# Altium footprint library My Footprint.PcbLib: 268 footprints (part 12 of 17)
Each footprint in its own frame and in the unit in brackets; x right, y up, seen from the top. Pads: shape width x height; smd on the part's side, far side on the other; paste and mask are expansions set on the pad; w line width, h text height; cw(c..) or ccw(c..) is an arc to the next point about the centre after c.
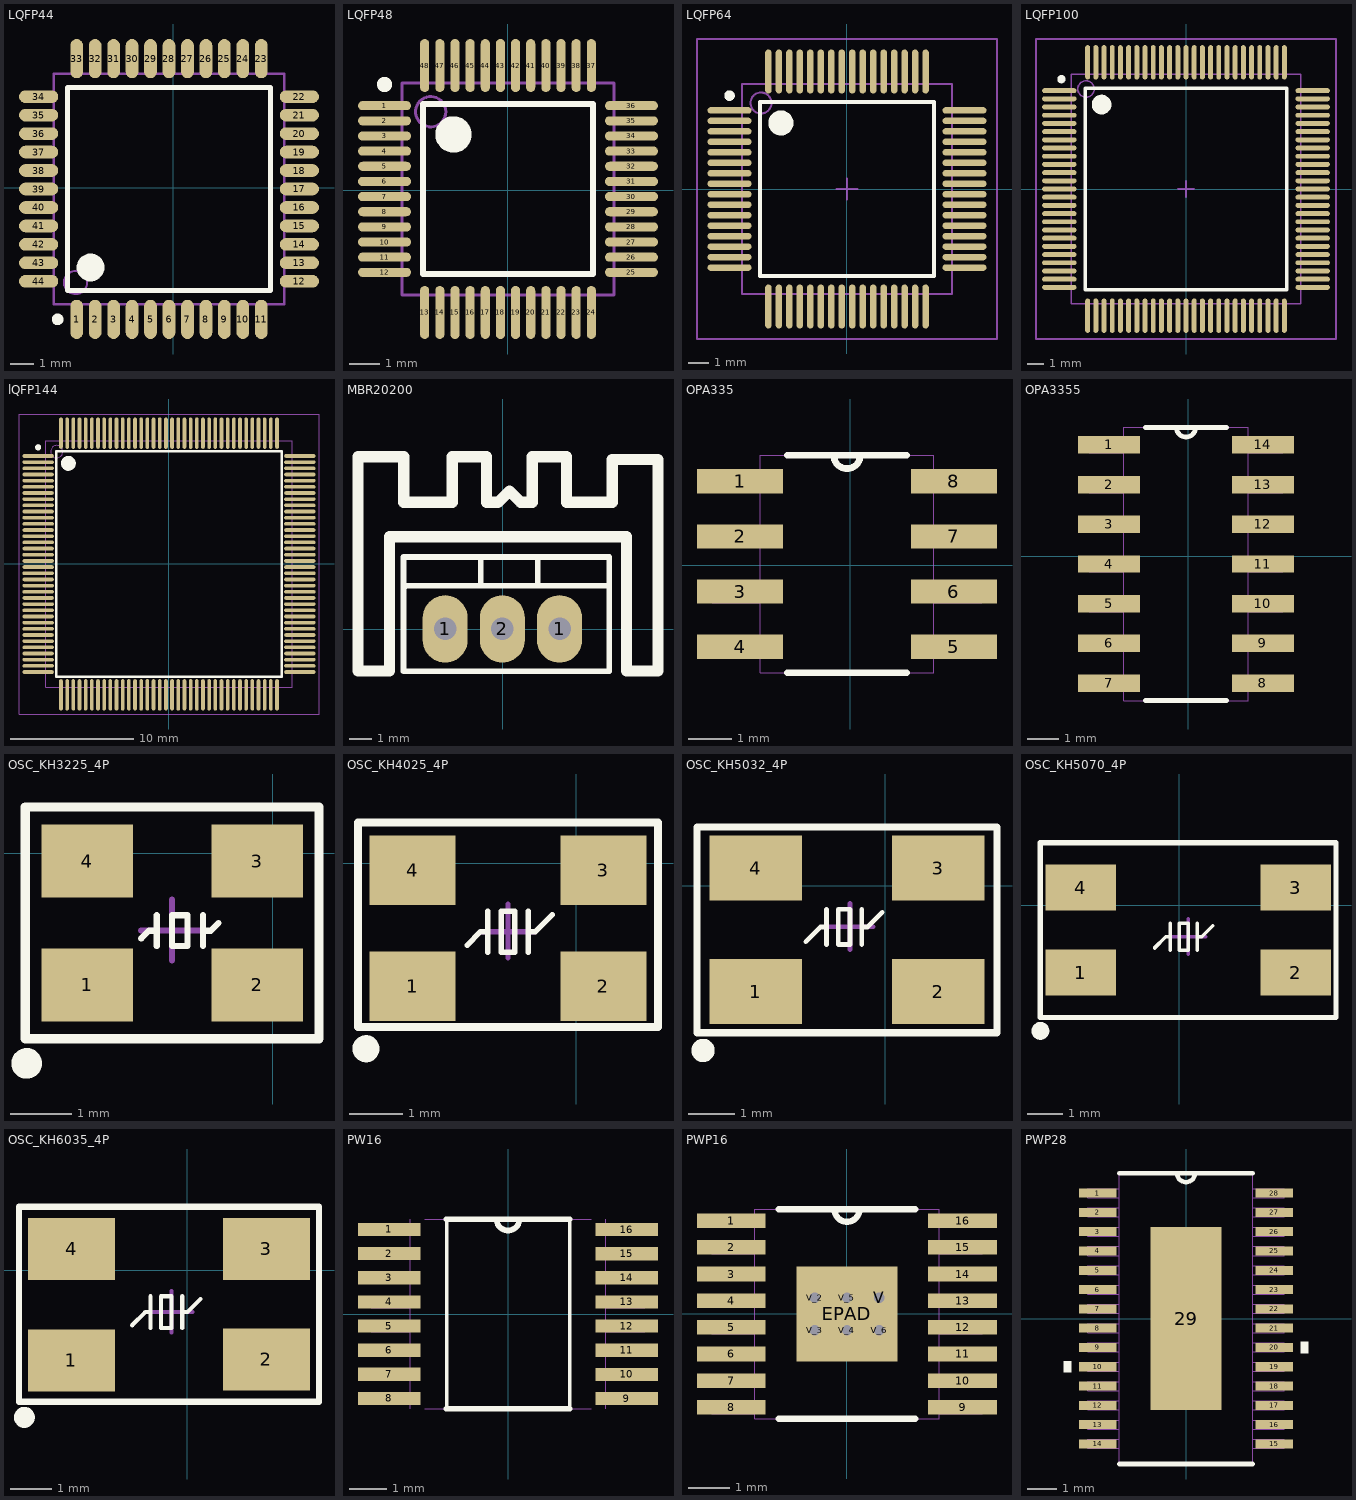
[diagram p11: the footprints below, top view; thin cyan lines are the x and y axes]

## LQFP44 [mm]
pads (44):
  oval 0.55x1.7 smd: 1(-4.191,-5.715) 2(-3.391,-5.715) 3(-2.591,-5.715) 4(-1.791,-5.715) 5(-0.991,-5.715) 6(-0.191,-5.715) 7(0.609,-5.715) 8(1.409,-5.715) 9(2.209,-5.715) 10(3.009,-5.715) 11(3.809,-5.715) 23(3.809,5.585) 24(3.009,5.585) 25(2.209,5.585) 26(1.409,5.585) 27(0.609,5.585) 28(-0.191,5.585) 29(-0.991,5.585) 30(-1.791,5.585) 31(-2.591,5.585) 32(-3.391,5.585) 33(-4.191,5.585)
  oval 1.7x0.55 smd: 12(5.459,-4.065) 13(5.459,-3.265) 14(5.459,-2.465) 15(5.459,-1.665) 16(5.459,-0.865) 17(5.459,-0.065) 18(5.459,0.735) 19(5.459,1.535) 20(5.459,2.335) 21(5.459,3.135) 22(5.459,3.935) 34(-5.841,3.935) 35(-5.841,3.135) 36(-5.841,2.335) 37(-5.841,1.535) 38(-5.841,0.735) 39(-5.841,-0.065) 40(-5.841,-0.865) 41(-5.841,-1.665) 42(-5.841,-2.465) 43(-5.841,-3.265) 44(-5.841,-4.065)
Top Overlay:
  circle w0.6: c-3.591,-3.465 r0.3
  circle w0.25: c-5.016,-5.715 r0.125
  lines w0.2: -4.591,-4.465 -4.591,4.335 4.209,4.335 4.209,-4.465 -4.591,-4.465
Mechanical 13:
  circle w0.1: c-4.241,-4.115 r0.5
  lines w0.1: -5.191,-5.065 -5.191,4.935 4.809,4.935 4.809,-5.065 -5.191,-5.065
3D body: height 1.5, standoff 0.1, extent -5.19,-5.064 4.808,4.934

## LQFP48 [mm]
pads (48):
  oval 1.75x0.3 smd: 1(-4.064,2.794) 2(-4.064,2.294) 3(-4.064,1.794) 4(-4.064,1.294) 5(-4.064,0.794) 6(-4.064,0.294) 7(-4.064,-0.206) 8(-4.064,-0.706) 9(-4.064,-1.206) 10(-4.064,-1.706) 11(-4.064,-2.206) 12(-4.064,-2.706) 25(4.086,-2.706) 26(4.086,-2.206) 27(4.086,-1.706) 28(4.086,-1.206) 29(4.086,-0.706) 30(4.086,-0.206) 31(4.086,0.294) 32(4.086,0.794) 33(4.086,1.294) 34(4.086,1.794) 35(4.086,2.294) 36(4.086,2.794)
  oval 0.3x1.75 smd: 13(-2.739,-4.031) 14(-2.239,-4.031) 15(-1.739,-4.031) 16(-1.239,-4.031) 17(-0.739,-4.031) 18(-0.239,-4.031) 19(0.261,-4.031) 20(0.761,-4.031) 21(1.261,-4.031) 22(1.761,-4.031) 23(2.261,-4.031) 24(2.761,-4.031) 37(2.761,4.119) 38(2.261,4.119) 39(1.761,4.119) 40(1.261,4.119) 41(0.761,4.119) 42(0.261,4.119) 43(-0.239,4.119) 44(-0.739,4.119) 45(-1.239,4.119) 46(-1.739,4.119) 47(-2.239,4.119) 48(-2.739,4.119)
Top Overlay:
  circle w0.25: c-4.064,3.494 r0.125
  circle w0.6: c-1.789,1.844 r0.3
  lines w0.2: -2.789,-2.756 -2.789,2.844 2.811,2.844 2.811,-2.756 -2.789,-2.756
Mechanical 13:
  circle w0.1: c-2.539,2.594 r0.5
  lines w0.1: -3.489,-3.456 -3.489,3.544 3.511,3.544 3.511,-3.456 -3.489,-3.456
3D body "LQFP7X7-48.STEP": height 1.56, standoff 0, extent -4.5,-4.436 4.5,4.564

## LQFP64 [mm] "中等容量RBT6"
pads (64):
  oval 2.1x0.3 smd: 1(-5.6,3.75) 2(-5.6,3.25) 3(-5.6,2.75) 4(-5.6,2.25) 5(-5.6,1.75) 6(-5.6,1.25) 7(-5.6,0.75) 8(-5.6,0.25) 9(-5.6,-0.25) 10(-5.6,-0.75) 11(-5.6,-1.25) 12(-5.6,-1.75) 13(-5.6,-2.25) 14(-5.6,-2.75) 15(-5.6,-3.25) 16(-5.6,-3.75) 33(5.6,-3.75) 34(5.6,-3.25) 35(5.6,-2.75) 36(5.6,-2.25) 37(5.6,-1.75) 38(5.6,-1.25) 39(5.6,-0.75) 40(5.6,-0.25) 41(5.6,0.25) 42(5.6,0.75) 43(5.6,1.25) 44(5.6,1.75) 45(5.6,2.25) 46(5.6,2.75) 47(5.6,3.25) 48(5.6,3.75)
  oval 0.3x2.1 smd: 17(-3.75,-5.6) 18(-3.25,-5.6) 19(-2.75,-5.6) 20(-2.25,-5.6) 21(-1.75,-5.6) 22(-1.25,-5.6) 23(-0.75,-5.6) 24(-0.25,-5.6) 25(0.25,-5.6) 26(0.75,-5.6) 27(1.25,-5.6) 28(1.75,-5.6) 29(2.25,-5.6) 30(2.75,-5.6) 31(3.25,-5.6) 32(3.75,-5.6) 49(3.75,5.6) 50(3.25,5.6) 51(2.75,5.6) 52(2.25,5.6) 53(1.75,5.6) 54(1.25,5.6) 55(0.75,5.6) 56(0.25,5.6) 57(-0.25,5.6) 58(-0.75,5.6) 59(-1.25,5.6) 60(-1.75,5.6) 61(-2.25,5.6) 62(-2.75,5.6) 63(-3.25,5.6) 64(-3.75,5.6)
Top Overlay:
  circle w0.25: c-5.6,4.45 r0.125
  circle w0.6: c-3.15,3.15 r0.3
  lines w0.2: -4.15,-4.15 -4.15,4.15 4.15,4.15 4.15,-4.15 -4.15,-4.15
Mechanical 13:
  circle w0.1: c-4.1,4.1 r0.5
  lines w0.1: -5,-5 -5,5 5,5 5,-5 -5,-5
Mechanical 15:
  lines w0.1: -0.5,0 0.5,0 ; 0,-0.5 0,0.5 ; -7.15,-7.15 -7.15,7.15 7.15,7.15 7.15,-7.15 -7.15,-7.15
3D body "LQFP-64.STEP": height 1.6, standoff 0, extent -6,-6 6,6

## LQFP100 [mm]
pads (100):
  oval 2.1x0.3 smd: 1(-7.727,6) 2(-7.727,5.5) 3(-7.727,5) 4(-7.727,4.5) 5(-7.727,4) 6(-7.727,3.5) 7(-7.727,3) 8(-7.727,2.5) 9(-7.727,2) 10(-7.727,1.5) 11(-7.727,1) 12(-7.727,0.5) 13(-7.727,0) 14(-7.727,-0.5) 15(-7.727,-1) 16(-7.727,-1.5) 17(-7.727,-2) 18(-7.727,-2.5) 19(-7.727,-3) 20(-7.727,-3.5) 21(-7.727,-4) 22(-7.727,-4.5) 23(-7.727,-5) 24(-7.727,-5.5) 25(-7.727,-6) 51(7.727,-6) 52(7.727,-5.5) 53(7.727,-5) 54(7.727,-4.5) 55(7.727,-4) 56(7.727,-3.5) 57(7.727,-3) 58(7.727,-2.5) 59(7.727,-2) 60(7.727,-1.5) 61(7.727,-1) 62(7.727,-0.5) 63(7.727,0) 64(7.727,0.5) 65(7.727,1) 66(7.727,1.5) 67(7.727,2) 68(7.727,2.5) 69(7.727,3) 70(7.727,3.5) 71(7.727,4) 72(7.727,4.5) 73(7.727,5) 74(7.727,5.5) 75(7.727,6)
  oval 0.3x2.1 smd: 26(-6,-7.727) 27(-5.5,-7.727) 28(-5,-7.727) 29(-4.5,-7.727) 30(-4,-7.727) 31(-3.5,-7.727) 32(-3,-7.727) 33(-2.5,-7.727) 34(-2,-7.727) 35(-1.5,-7.727) 36(-1,-7.727) 37(-0.5,-7.727) 38(0,-7.727) 39(0.5,-7.727) 40(1,-7.727) 41(1.5,-7.727) 42(2,-7.727) 43(2.5,-7.727) 44(3,-7.727) 45(3.5,-7.727) 46(4,-7.727) 47(4.5,-7.727) 48(5,-7.727) 49(5.5,-7.727) 50(6,-7.727) 76(6,7.727) 77(5.5,7.727) 78(5,7.727) 79(4.5,7.727) 80(4,7.727) 81(3.5,7.727) 82(3,7.727) 83(2.5,7.727) 84(2,7.727) 85(1.5,7.727) 86(1,7.727) 87(0.5,7.727) 88(0,7.727) 89(-0.5,7.727) 90(-1,7.727) 91(-1.5,7.727) 92(-2,7.727) 93(-2.5,7.727) 94(-3,7.727) 95(-3.5,7.727) 96(-4,7.727) 97(-4.5,7.727) 98(-5,7.727) 99(-5.5,7.727) 100(-6,7.727)
Top Overlay:
  circle w0.6: c-5.15,5.15 r0.3
  circle w0.25: c-7.6,6.7 r0.125
  lines w0.2: -6.15,-6.15 6.15,-6.15 6.15,6.15 -6.15,6.15 -6.15,-6.15
Mechanical 13:
  circle w0.1: c-6.1,6.1 r0.5
  lines w0.1: -7,-7 7,-7 7,7 -7,7 -7,-7
Mechanical 15:
  lines w0.1: -0.5,0 0.5,0 ; 0,-0.5 0,0.5 ; -9.15,-9.15 9.15,-9.15 9.15,9.15 -9.15,9.15 -9.15,-9.15
3D body "LQFP-100.STEP": height 1.6, standoff 0, extent -7.999,-8 8.001,8

## lQFP144 [mm]
pads (144):
  oval 2.54x0.3 smd: 1(-10.6,8.75) 2(-10.6,8.25) 3(-10.6,7.75) 4(-10.6,7.25) 5(-10.6,6.75) 6(-10.6,6.25) 7(-10.6,5.75) 8(-10.6,5.25) 9(-10.6,4.75) 10(-10.6,4.25) 11(-10.6,3.75) 12(-10.6,3.25) 13(-10.6,2.75) 14(-10.6,2.25) 15(-10.6,1.75) 16(-10.6,1.25) 17(-10.6,0.75) 18(-10.6,0.25) 19(-10.6,-0.25) 20(-10.6,-0.75) 21(-10.6,-1.25) 22(-10.6,-1.75) 23(-10.6,-2.25) 24(-10.6,-2.75) 25(-10.6,-3.25) 26(-10.6,-3.75) 27(-10.6,-4.25) 28(-10.6,-4.75) 29(-10.6,-5.25) 30(-10.6,-5.75) 31(-10.6,-6.25) 32(-10.6,-6.75) 33(-10.6,-7.25) 34(-10.6,-7.75) 35(-10.6,-8.25) 36(-10.6,-8.75) 73(10.6,-8.75) 74(10.6,-8.25) 75(10.6,-7.75) 76(10.6,-7.25) 77(10.6,-6.75) 78(10.6,-6.25) 79(10.6,-5.75) 80(10.6,-5.25) 81(10.6,-4.75) 82(10.6,-4.25) 83(10.6,-3.75) 84(10.6,-3.25) 85(10.6,-2.75) 86(10.6,-2.25) 87(10.6,-1.75) 88(10.6,-1.25) 89(10.6,-0.75) 90(10.6,-0.25) 91(10.6,0.25) 92(10.6,0.75) 93(10.6,1.25) 94(10.6,1.75) 95(10.6,2.25) 96(10.6,2.75) 97(10.6,3.25) 98(10.6,3.75) 99(10.6,4.25) 100(10.6,4.75) 101(10.6,5.25) 102(10.6,5.75) 103(10.6,6.25) 104(10.6,6.75) 105(10.6,7.25) 106(10.6,7.75) 107(10.6,8.25) 108(10.6,8.75)
  oval 0.3x2.54 smd: 37(-8.75,-10.6) 38(-8.25,-10.6) 39(-7.75,-10.6) 40(-7.25,-10.6) 41(-6.75,-10.6) 42(-6.25,-10.6) 43(-5.75,-10.6) 44(-5.25,-10.6) 45(-4.75,-10.6) 46(-4.25,-10.6) 47(-3.75,-10.6) 48(-3.25,-10.6) 49(-2.75,-10.6) 50(-2.25,-10.6) 51(-1.75,-10.6) 52(-1.25,-10.6) 53(-0.75,-10.6) 54(-0.25,-10.6) 55(0.25,-10.6) 56(0.75,-10.6) 57(1.25,-10.6) 58(1.75,-10.6) 59(2.25,-10.6) 60(2.75,-10.6) 61(3.25,-10.6) 62(3.75,-10.6) 63(4.25,-10.6) 64(4.75,-10.6) 65(5.25,-10.6) 66(5.75,-10.6) 67(6.25,-10.6) 68(6.75,-10.6) 69(7.25,-10.6) 70(7.75,-10.6) 71(8.25,-10.6) 72(8.75,-10.6) 109(8.75,10.6) 110(8.25,10.6) 111(7.75,10.6) 112(7.25,10.6) 113(6.75,10.6) 114(6.25,10.6) 115(5.75,10.6) 116(5.25,10.6) 117(4.75,10.6) 118(4.25,10.6) 119(3.75,10.6) 120(3.25,10.6) 121(2.75,10.6) 122(2.25,10.6) 123(1.75,10.6) 124(1.25,10.6) 125(0.75,10.6) 126(0.25,10.6) 127(-0.25,10.6) 128(-0.75,10.6) 129(-1.25,10.6) 130(-1.75,10.6) 131(-2.25,10.6) 132(-2.75,10.6) 133(-3.25,10.6) 134(-3.75,10.6) 135(-4.25,10.6) 136(-4.75,10.6) 137(-5.25,10.6) 138(-5.75,10.6) 139(-6.25,10.6) 140(-6.75,10.6) 141(-7.25,10.6) 142(-7.75,10.6) 143(-8.25,10.6) 144(-8.75,10.6)
Top Overlay:
  circle w0.6: c-8.15,8.15 r0.3
  circle w0.25: c-10.6,9.45 r0.125
  lines w0.2: -9.15,-9.15 9.15,-9.15 9.15,9.15 -9.15,9.15 -9.15,-9.15
Mechanical 13:
  circle w0.1: c-9.1,9.1 r0.5
  lines w0.1: -10,-10 10,-10 10,10 -10,10 -10,-10
Mechanical 15:
  lines w0.05: -12.15,-12.15 12.15,-12.15 12.15,12.15 -12.15,12.15 -12.15,-12.15
3D body "LQFP20X20-144.STEP": height 1.6, standoff 0, extent -11,-11 11,11

## MBR20200 [mm]
pads (3):
  oval 2x3 hole 1: 1(-2.568,0.003) 1(2.512,0.003) 2(-0.028,0.003)
Top Overlay:
  lines w0.254: -4.42,1.549 -4.42,2.819 -4.42,3.2 4.724,3.2 4.724,1.676 ; -0.991,2.057 -0.991,3.2 ; 1.549,1.93 1.549,3.073 ; 4.597,1.93 -3.785,1.93 -4.293,1.93 -4.42,1.803 -4.42,-1.88 4.724,-1.88 4.724,1.93
  lines w0.5: -6.445,-1.861 -5.048,-1.861 -5.048,4.108 5.493,4.108 5.493,-1.861 6.89,-1.861 6.89,7.537 4.858,7.537 4.858,5.632 2.826,5.632 2.826,7.664 1.302,7.664 1.302,5.632 0.794,5.632 0.286,6.14 -0.222,5.632 -0.73,5.632 -0.73,7.664 -2.254,7.664 -2.254,5.632 -4.413,5.632 -4.413,7.664 -6.445,7.664 -6.445,5.632 -6.445,-1.861
3D body "三?": height 19.3, standoff -4.92, extent -5.182,-1.659 4.948,3.741

## OPA335 [mil]
pads (8):
  rect 78x22 smd: 1(-100,76) 2(-100,26) 3(-100,-24) 4(-100,-74) 5(94,-74) 6(94,-24) 7(94,26) 8(94,76)
Top Overlay:
  lines w6: -57.08,-97.5 51.08,-97.5 ; -57.08,99.5 51.08,99.5 ; -15,99.5 ccw(c-3,99.5) 9,99.5
Mechanical 1:
  lines w0: -15,99.5 ccw(c-3,99.5) 9,99.5 ; -125,-84 -125,-64 -81.5,-64 -81.5,-84 -125,-84 ; -125,-34 -125,-14 -81.5,-14 -81.5,-34 -125,-34 ; -125,16 -125,36 -81.5,36 -81.5,16 -125,16 ; -125,66 -125,86 -81.5,86 -81.5,66 -125,66 ; -81.5,-97.5 75.5,-97.5 75.5,99.5 -81.5,99.5 -81.5,-97.5 ; 75.5,-84 75.5,-64 119,-64 119,-84 75.5,-84 ; 75.5,-34 75.5,-14 119,-14 119,-34 75.5,-34 ; 75.5,16 75.5,36 119,36 119,16 75.5,16 ; 75.5,66 75.5,86 119,86 119,66 75.5,66
3D body "D0008A.stp": height 64.61, standoff 0.63, extent -121.11,-95.46 115.11,97.45

## OPA3355 [mil]
pads (14):
  rect 78x22 smd: 1(-100,140) 2(-100,90) 3(-100,40) 4(-100,-10) 5(-100,-60) 6(-100,-110) 7(-100,-160) 8(94,-160) 9(94,-110) 10(94,-60) 11(94,-10) 12(94,40) 13(94,90) 14(94,140)
Top Overlay:
  lines w6: -53.89,-182 47.89,-182 ; -53.89,162 47.89,162 ; -15,162 ccw(c-3,162) 9,162
Mechanical 1:
  lines w0: -15,162 ccw(c-3,162) 9,162 ; -125,-170 -81.5,-170 -81.5,-150 -125,-150 -125,-170 ; -125,-120 -81.5,-120 -81.5,-100 -125,-100 -125,-120 ; -125,-70 -81.5,-70 -81.5,-50 -125,-50 -125,-70 ; -125,-20 -81.5,-20 -81.5,0 -125,0 -125,-20 ; -125,30 -81.5,30 -81.5,50 -125,50 -125,30 ; -125,80 -81.5,80 -81.5,100 -125,100 -125,80 ; -125,130 -81.5,130 -81.5,150 -125,150 -125,130 ; -81.5,-182 -81.5,162 75.5,162 75.5,-182 -81.5,-182 ; 75.5,-170 119,-170 119,-150 75.5,-150 75.5,-170 ; 75.5,-120 119,-120 119,-100 75.5,-100 75.5,-120 ; 75.5,-70 119,-70 119,-50 75.5,-50 75.5,-70 ; 75.5,-20 119,-20 119,0 75.5,0 75.5,-20 ; 75.5,30 119,30 119,50 75.5,50 75.5,30 ; 75.5,80 119,80 119,100 75.5,100 75.5,80 ; 75.5,130 119,130 119,150 75.5,150 75.5,130
3D body "D0014A.stp": height 61.5, standoff -1.5, extent -122,-180 116,160

## OSC_KH3225_4P [mil]
pads (4):
  rect 59.06x47.24 smd: 1(-120,-85) 2(-10,-85) 3(-10,-5) 4(-120,-5)
Top Overlay:
  circle w10: c-159.13,-135.87 r4.92
  lines w4: -85,-55 -80,-50 -75,-50 ; -75,-60 -75,-40 ; -45,-60 -45,-40 ; -45,-50 -40,-50 -35,-45 ; -65,-60 -55,-60 -55,-40 -65,-40 -65,-60
  lines w6.06: -160,-120 30,-120 30,30 -160,30 -160,-120
Mechanical 15:
  lines w3.94: -85,-50 -45.63,-50 ; -65,-69.37 -65,-30
3D body "XTAL-Crystal SMD 3.2X2.5.STEP": height 30.51, standoff 0, extent -127.99,-94.21 -2,4.22

## OSC_KH4025_4P [mil]
pads (4):
  rect 62.99x51.18 smd: 1(-120,-90) 2(20,-90) 3(20,-5) 4(-120,-5)
Top Overlay:
  circle w10: c-154.13,-135.87 r4.92
  lines w4: -80,-60 -70,-50 -65,-50 ; -65,-65 -65,-35 ; -35,-65 -35,-35 ; -35,-50 -30,-50 -17.5,-37.5 ; -55,-65 -55,-35 -45,-35 -45,-65 -55,-65
  lines w6.06: -160,-120 -160,30 60,30 60,-120 -160,-120
Mechanical 15:
  lines w3.94: -70,-50 -30.63,-50 ; -50,-69.37 -50,-30

## OSC_KH5032_4P [mil]
pads (4):
  rect 78.74x55.12 smd: 1(-110,-90) 2(45,-90) 3(45,15) 4(-110,15)
Top Overlay:
  circle w10: c-154.92,-140 r4.92
  lines w4: -67.5,-47.5 -55,-35 -50,-35 ; -50,-50 -50,-20 ; -20,-50 -20,-20 ; -20,-35 -15,-35 -2.5,-22.5 ; -40,-50 -40,-20 -30,-20 -30,-50 -40,-50
  lines w6.06: -160,-125 -160,50 95,50 95,-125 -160,-125
Mechanical 15:
  lines w3.94: -49.69,-35 -10.31,-35 ; -30,-54.37 -30,-15
3D body "XTAL-Crystal SMD 5X3.2.STEP": height 39.37, standoff 0, extent -128.43,-100 68.43,25.98

## OSC_KH5070_4P [mm]
pads (4):
  rect 2x1.3 smd: 1(-2.794,-1.905) 2(3.302,-1.905) 3(3.302,0.508) 4(-2.794,0.508)
Top Overlay:
  circle w0.254: c-3.935,-3.556 r0.125
  lines w0.102: -0.699,-1.206 -0.381,-0.889 -0.254,-0.889 ; -0.254,-1.27 -0.254,-0.508 ; 0.508,-1.27 0.508,-0.508 ; 0.508,-0.889 0.635,-0.889 0.953,-0.572 ; 0,-1.27 0,-0.508 0.254,-0.508 0.254,-1.27 0,-1.27
  lines w0.145: -3.937,-3.175 4.445,-3.175 ; -3.937,1.778 4.445,1.778
  lines w0.154: -3.937,-3.175 -3.937,1.778 ; 4.445,-3.175 4.445,1.778
Mechanical 15:
  lines w0.1: -0.246,-0.889 0.754,-0.889 ; 0.254,-1.381 0.254,-0.381

## OSC_KH6035_4P [mm]
pads (4):
  rect 2.1x1.5 smd: 1(-2.8,-2.18) 2(1.905,-2.159) 3(1.905,0.508) 4(-2.794,0.508)
Top Overlay:
  circle w0.254: c-3.935,-3.556 r0.125
  lines w0.102: -1.333,-1.333 -1.016,-1.016 -0.889,-1.016 ; -0.889,-1.397 -0.889,-0.635 ; -0.127,-1.397 -0.127,-0.635 ; -0.127,-1.016 0,-1.016 0.318,-0.699 ; -0.635,-1.397 -0.635,-0.635 -0.381,-0.635 -0.381,-1.397 -0.635,-1.397
  lines w0.154: -4.064,-3.175 3.175,-3.175 3.175,1.524 -4.064,1.524 -4.064,-3.175
Mechanical 15:
  lines w0.1: -0.881,-1.016 0.119,-1.016 ; -0.381,-1.508 -0.381,-0.508

## PW16 [mil]
pads (16):
  rect 66x14 smd: 1(-126,89.59) 2(-126,64) 3(-126,38.41) 4(-126,12.82) 5(-126,-12.77) 6(-126,-38.36) 7(-126,-63.95) 8(-126,-89.54) 9(126,-89.57) 10(126,-63.98) 11(126,-38.39) 12(126,-12.8) 13(126,12.8) 14(126,38.39) 15(126,63.98) 16(126,89.57)
Top Overlay:
  lines w4: -65,-101 -65,100 ; 65.5,-100.5 65.5,100.5
  lines w6: -65.5,-100.5 65.5,-100.5 ; -65.5,100.5 65.5,100.5 ; -12,100.5 ccw(c0,100.5) 12,100.5
Mechanical 1:
  lines w0: -103.5,-100.48 -103.5,100.52 ; -88.5,-100.5 88.5,-100.5 ; -88.5,100.5 88.5,100.5 ; -12,100.5 ccw(c0,100.5) 12,100.5 ; 103.5,-100.5 103.5,100.5 ; -145,-95.54 -103.5,-95.54 -103.5,-83.54 -145,-83.54 -145,-95.54 ; -145,-69.95 -103.5,-69.95 -103.5,-57.95 -145,-57.95 -145,-69.95 ; -145,-44.36 -103.5,-44.36 -103.5,-32.36 -145,-32.36 -145,-44.36 ; -145,-18.77 -103.5,-18.77 -103.5,-6.77 -145,-6.77 -145,-18.77 ; -145,6.82 -103.5,6.82 -103.5,18.82 -145,18.82 -145,6.82 ; -145,32.41 -103.5,32.41 -103.5,44.41 -145,44.41 -145,32.41 ; -145,58 -103.5,58 -103.5,70 -145,70 -145,58 ; -145,83.59 -103.5,83.59 -103.5,95.59 -145,95.59 -145,83.59 ; 103.5,-95.57 145,-95.57 145,-83.57 103.5,-83.57 103.5,-95.57 ; 103.5,-69.98 145,-69.98 145,-57.98 103.5,-57.98 103.5,-69.98 ; 103.5,-44.39 145,-44.39 145,-32.39 103.5,-32.39 103.5,-44.39 ; 103.5,-18.8 145,-18.8 145,-6.8 103.5,-6.8 103.5,-18.8 ; 103.5,6.8 145,6.8 145,18.8 103.5,18.8 103.5,6.8 ; 103.5,32.39 145,32.39 145,44.39 103.5,44.39 103.5,32.39 ; 103.5,57.98 145,57.98 145,69.98 103.5,69.98 103.5,57.98 ; 103.5,83.57 145,83.57 145,95.57 103.5,95.57 103.5,83.57
3D body "PW0016A（8802?": height 39.86, standoff 0.49, extent -126.38,-98.42 126.39,98.43

## PWP16 [mil]
pads (23):
  rect 66x14 smd: 1(-111,89.57) 2(-111,63.98) 3(-111,38.39) 4(-111,12.8) 5(-111,-12.8) 6(-111,-38.39) 7(-111,-63.98) 8(-111,-89.57) 9(111,-89.57) 10(111,-63.98) 11(111,-38.39) 12(111,-12.8) 13(111,12.8) 14(111,38.39) 15(111,63.98) 16(111,89.57)
  rect 96.85x90.94 smd paste-47.93 mask-48: EPAD(0,0)
  round 20 / inner round 60 / far side round 20 hole 10: V(31,15.5) V_2(-31,15.5) V_3(-31,-15.5) V_4(0,-15.5) V_5(0,15.5) V_6(31,-15.5)
Top Overlay:
  lines w6: -65.5,-100.5 65.5,-100.5 ; -65.5,100.5 65.5,100.5 ; -12,100.5 ccw(c0,100.5) 12,100.5
Top Paste:
  region: 45.48,-19.44 40.5,-19.44 34.94,-25 34.94,-42.52 45.48,-42.52
  region: 45.48,11.56 40.5,11.56 34.94,6 34.94,-6 40.5,-11.56 45.48,-11.56
  region: 45.48,42.52 34.94,42.52 34.94,25 40.5,19.44 45.48,19.44
  region: 21.5,-19.44 9.5,-19.44 3.94,-25 3.94,-42.52 27.06,-42.52 27.06,-25
  region: 21.5,11.56 9.5,11.56 3.94,6 3.94,-6 9.5,-11.56 21.5,-11.56 27.06,-6 27.06,6
  region: 27.06,42.52 3.94,42.52 3.94,25 9.5,19.44 21.5,19.44 27.06,25
  region: -9.5,-19.44 -21.5,-19.44 -27.06,-25 -27.06,-42.52 -3.94,-42.52 -3.94,-25
  region: -9.5,11.56 -21.5,11.56 -27.06,6 -27.06,-6 -21.5,-11.56 -9.5,-11.56 -3.94,-6 -3.94,6
  region: -3.94,42.52 -27.06,42.52 -27.06,25 -21.5,19.44 -9.5,19.44 -3.94,25
  region: -40.5,-19.44 -45.48,-19.44 -45.48,-42.52 -34.94,-42.52 -34.94,-25
  region: -40.5,11.56 -45.48,11.56 -45.48,-11.56 -40.5,-11.56 -34.94,-6 -34.94,6
  region: -34.94,42.52 -45.48,42.52 -45.48,19.44 -40.5,19.44 -34.94,25
Top Solder:
  region: 38.87,-47.97 38.87,47.97 50.93,47.97 50.93,-47.97
  region: 23.13,-47.97 23.13,47.97 7.87,47.97 7.87,-47.97
  region: -7.87,-47.97 -7.87,47.97 -23.13,47.97 -23.13,-47.97
  region: -50.93,-47.97 -50.93,47.97 -38.87,47.97 -38.87,-47.97
  region: -50.93,-47.97 -50.93,-23.37 50.93,-23.37 50.93,-47.97
  region: -50.93,-7.63 -50.93,7.63 50.93,7.63 50.93,-7.63
  region: -50.93,23.37 -50.93,47.97 50.93,47.97 50.93,23.37
Mechanical 1:
  lines w0: -12,100.5 ccw(c0,100.5) 12,100.5 ; -130,-95.57 -88.5,-95.57 -88.5,-83.57 -130,-83.57 -130,-95.57 ; -130,-69.98 -88.5,-69.98 -88.5,-57.98 -130,-57.98 -130,-69.98 ; -130,-44.39 -88.5,-44.39 -88.5,-32.39 -130,-32.39 -130,-44.39 ; -130,-18.8 -88.5,-18.8 -88.5,-6.8 -130,-6.8 -130,-18.8 ; -130,6.8 -88.5,6.8 -88.5,18.8 -130,18.8 -130,6.8 ; -130,32.39 -88.5,32.39 -88.5,44.39 -130,44.39 -130,32.39 ; -130,57.98 -88.5,57.98 -88.5,69.98 -130,69.98 -130,57.98 ; -130,83.57 -88.5,83.57 -88.5,95.57 -130,95.57 -130,83.57 ; -88.5,-100.5 -88.5,100.5 88.5,100.5 88.5,-100.5 -88.5,-100.5 ; 88.5,-95.57 130,-95.57 130,-83.57 88.5,-83.57 88.5,-95.57 ; 88.5,-69.98 130,-69.98 130,-57.98 88.5,-57.98 88.5,-69.98 ; 88.5,-44.39 130,-44.39 130,-32.39 88.5,-32.39 88.5,-44.39 ; 88.5,-18.8 130,-18.8 130,-6.8 88.5,-6.8 88.5,-18.8 ; 88.5,6.8 130,6.8 130,18.8 88.5,18.8 88.5,6.8 ; 88.5,32.39 130,32.39 130,44.39 88.5,44.39 88.5,32.39 ; 88.5,57.98 130,57.98 130,69.98 88.5,69.98 88.5,57.98 ; 88.5,83.57 130,83.57 130,95.57 88.5,95.57 88.5,83.57
3D body "PWP0016A.stp": height 40.22, standoff 0.85, extent -126.34,-98.42 126.33,98.43

## PWP28 [mil]
pads (29):
  rect 50x12 smd: 1(-117,166.34) 2(-117,140.75) 3(-117,115.16) 4(-117,89.57) 5(-117,63.98) 6(-117,38.39) 7(-117,12.8) 8(-117,-12.8) 9(-117,-38.39) 10(-117,-63.98) 11(-117,-89.57) 12(-117,-115.16) 13(-117,-140.75) 14(-117,-166.34) 15(117,-166.34) 16(117,-140.75) 17(117,-115.16) 18(117,-89.57) 19(117,-63.98) 20(117,-38.39) 21(117,-12.8) 22(117,12.8) 23(117,38.39) 24(117,63.98) 25(117,89.57) 26(117,115.16) 27(117,140.75) 28(117,166.34)
  rect 94.49x242.91 smd: 29(0,0)
Top Overlay:
  region: 152,-30.89 162,-30.89 162,-45.89 152,-45.89
  region: -152,-56.48 -162,-56.48 -162,-71.48 -152,-71.48
  lines w6: -88.5,-192.91 88.5,-192.91 ; -88.5,192.91 88.5,192.91 ; -12,192.91 ccw(c0,192.91) 12,192.91
Mechanical 1:
  lines w0: -12,192.91 ccw(c0,192.91) 12,192.91 ; -130,-172.34 -88.5,-172.34 -88.5,-160.34 -130,-160.34 -130,-172.34 ; -130,-146.75 -88.5,-146.75 -88.5,-134.75 -130,-134.75 -130,-146.75 ; -130,-121.16 -88.5,-121.16 -88.5,-109.16 -130,-109.16 -130,-121.16 ; -130,-95.57 -88.5,-95.57 -88.5,-83.57 -130,-83.57 -130,-95.57 ; -130,-69.98 -88.5,-69.98 -88.5,-57.98 -130,-57.98 -130,-69.98 ; -130,-44.39 -88.5,-44.39 -88.5,-32.39 -130,-32.39 -130,-44.39 ; -130,-18.8 -88.5,-18.8 -88.5,-6.8 -130,-6.8 -130,-18.8 ; -130,6.8 -88.5,6.8 -88.5,18.8 -130,18.8 -130,6.8 ; -130,32.39 -88.5,32.39 -88.5,44.39 -130,44.39 -130,32.39 ; -130,57.98 -88.5,57.98 -88.5,69.98 -130,69.98 -130,57.98 ; -130,83.57 -88.5,83.57 -88.5,95.57 -130,95.57 -130,83.57 ; -130,109.16 -88.5,109.16 -88.5,121.16 -130,121.16 -130,109.16 ; -130,134.75 -88.5,134.75 -88.5,146.75 -130,146.75 -130,134.75 ; -130,160.34 -88.5,160.34 -88.5,172.34 -130,172.34 -130,160.34 ; -88.5,-192.91 -88.5,192.91 88.5,192.91 88.5,-192.91 -88.5,-192.91 ; 88.5,-172.34 130,-172.34 130,-160.34 88.5,-160.34 88.5,-172.34 ; 88.5,-146.75 130,-146.75 130,-134.75 88.5,-134.75 88.5,-146.75 ; 88.5,-121.16 130,-121.16 130,-109.16 88.5,-109.16 88.5,-121.16 ; 88.5,-95.57 130,-95.57 130,-83.57 88.5,-83.57 88.5,-95.57 ; 88.5,-69.98 130,-69.98 130,-57.98 88.5,-57.98 88.5,-69.98 ; 88.5,-44.39 130,-44.39 130,-32.39 88.5,-32.39 88.5,-44.39 ; 88.5,-18.8 130,-18.8 130,-6.8 88.5,-6.8 88.5,-18.8 ; 88.5,6.8 130,6.8 130,18.8 88.5,18.8 88.5,6.8 ; 88.5,32.39 130,32.39 130,44.39 88.5,44.39 88.5,32.39 ; 88.5,57.98 130,57.98 130,69.98 88.5,69.98 88.5,57.98 ; 88.5,83.57 130,83.57 130,95.57 88.5,95.57 88.5,83.57 ; 88.5,109.16 130,109.16 130,121.16 88.5,121.16 88.5,109.16 ; 88.5,134.75 130,134.75 130,146.75 88.5,146.75 88.5,134.75 ; 88.5,160.34 130,160.34 130,172.34 88.5,172.34 88.5,160.34
3D body "PWP0028A.stp": height 39.86, standoff 0.49, extent -126.38,-190.94 126.39,190.95